# Altium footprint library ICs And Semiconductors SMD.PcbLib: 602 footprints (part 11 of 38)
Each footprint in its own frame and in the unit in brackets; x right, y up, seen from the top. Pads: shape width x height; smd on the part's side, far side on the other; paste and mask are expansions set on the pad; w line width, h text height; cw(c..) or ccw(c..) is an arc to the next point about the centre after c.
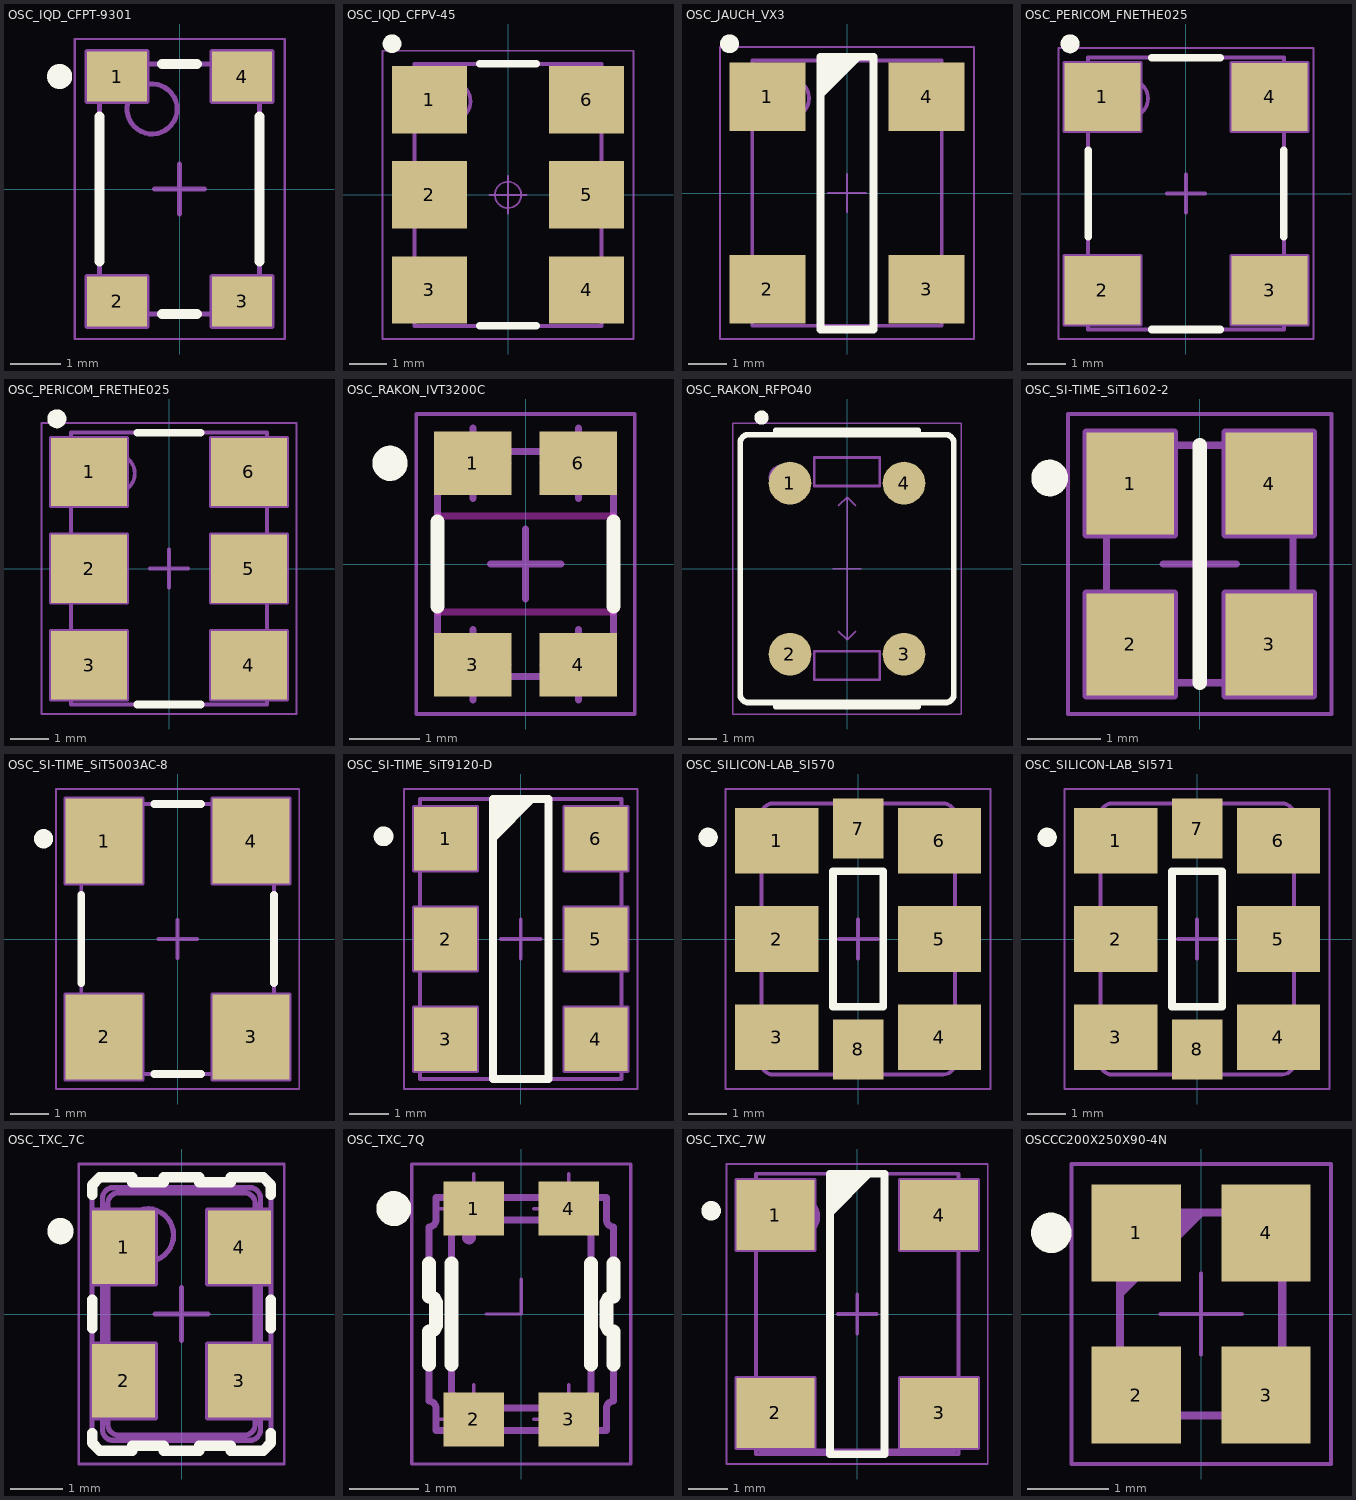
[diagram p10: the footprints below, top view; thin cyan lines are the x and y axes]

## OSC_IQD_CFPT-9301 [mm] "SMD Oscillator, Corner Convave, 4 pins, 5x3.2mm"
height 1.8
pads (4):
  rect 1.2x1 smd: 1(-1.25,2.25) 2(-1.25,-2.25) 3(1.25,-2.25) 4(1.25,2.25)
Top Overlay:
  circle w0.25: c-2.4,2.25 r0.125
  lines w0.2: -1.6,-1.45 -1.6,1.45 ; -0.35,-2.5 0.35,-2.5 ; -0.35,2.5 0.35,2.5 ; 1.6,-1.45 1.6,1.45
Mechanical 8:
  lines w0.1: -1.75,-2.25 -1.25,-2.25 ; -1.75,2.25 -1.25,2.25 ; -1.25,-2.75 -1.25,-2.25 ; -1.25,-1.75 -1.25,-2.25 ; -1.25,1.75 -1.25,2.25 ; -1.25,2.75 -1.25,2.25 ; -0.75,-2.25 -1.25,-2.25 ; -0.75,2.25 -1.25,2.25 ; -0.5,0 0,0 ; 0,-0.5 0,0 ; 0,0.5 0,0 ; 0.5,0 0,0 ; 0.75,-2.25 1.25,-2.25 ; 0.75,2.25 1.25,2.25 ; 1.25,-2.75 1.25,-2.25 ; 1.25,-1.75 1.25,-2.25 ; 1.25,1.75 1.25,2.25 ; 1.25,2.75 1.25,2.25 ; 1.75,-2.25 1.25,-2.25 ; 1.75,2.25 1.25,2.25 ; -1.85,-2.75 -1.85,-1.75 -0.65,-1.75 -0.65,-2.75 -1.85,-2.75 ; -1.85,1.75 -1.85,2.75 -0.65,2.75 -0.65,1.75 -1.85,1.75 ; 0.65,-2.75 0.65,-1.75 1.85,-1.75 1.85,-2.75 0.65,-2.75 ; 0.65,1.75 0.65,2.75 1.85,2.75 1.85,1.75 0.65,1.75
Mechanical 14:
  circle w0.1: c-0.55,1.6 r0.5
  lines w0.1: -1.6,-2.35 cw(c-1.6,-2.5) -1.45,-2.5 1.45,-2.5 cw(c1.6,-2.5) 1.6,-2.35 1.6,2.35 cw(c1.6,2.5) 1.45,2.5 -1.45,2.5 cw(c-1.6,2.5) -1.6,2.35 -1.6,-2.35
Mechanical 15:
  lines w0.05: -2.1,-3 -2.1,3 2.1,3 2.1,-3 -2.1,-3
3D body "OSC_IQD_CFPT-9301.stp": height 1.8, standoff 0, extent -1.6,-2.5 1.6,2.5

## OSC_IQD_CFPV-45 [mm] "SMD Oscillator, side convave, 6 pins, 5.00x7.00mm"
height 1.7
pads (6):
  rect 2x1.8 smd: 1(-2.1,2.54) 2(-2.1,0) 3(-2.1,-2.54) 4(2.1,-2.54) 5(2.1,0) 6(2.1,2.54)
Top Overlay:
  circle w0.25: c-3.1,4.04 r0.125
  lines w0.2: -0.75,-3.5 0.75,-3.5 ; -0.75,3.5 0.75,3.5
Mechanical 14:
  circle w0.1: c-1.5,2.5 r0.5
  lines w0.1: -2.5,-3.5 -2.5,3.5 2.5,3.5 2.5,-3.5 -2.5,-3.5
Mechanical 15:
  circle w0.05: c0,0 r0.35
  lines w0.05: -0.5,0 0.5,0 ; 0,-0.5 0,0.5 ; -3.35,-3.85 -3.35,3.85 3.35,3.85 3.35,-3.85 -3.35,-3.85
3D body "OSC_IQD_CFPV-45.stp": height 1.7, standoff 0, extent -2.6,-3.6 2.6,3.6

## OSC_JAUCH_VX3 [mm] "SMD Oscillator, Side Convave, 4 pins, 5.00x7.00mm, VX3 Serie"
height 1.75
pads (4):
  rect 2x1.8 smd: 1(-2.1,2.54) 2(-2.1,-2.54) 3(2.1,-2.54) 4(2.1,2.54)
Top Overlay:
  circle w0.25: c-3.1,3.94 r0.125
  lines w0.2: -0.7,2.6 0.3,3.6 ; -0.7,2.8 0.1,3.6 ; -0.7,3 -0.1,3.6 ; -0.7,3.2 -0.3,3.6 ; -0.7,3.4 -0.5,3.6 ; -0.7,-3.6 0.7,-3.6 0.7,3.6 -0.7,3.6 -0.7,-3.6
Mechanical 14:
  circle w0.1: c-1.5,2.5 r0.5
  lines w0.1: -2.5,-3.5 -2.5,3.5 2.5,3.5 2.5,-3.5 -2.5,-3.5
Mechanical 15:
  lines w0.05: -0.5,0 0.5,0 ; 0,-0.5 0,0.5 ; -3.35,-3.85 -3.35,3.85 3.35,3.85 3.35,-3.85 -3.35,-3.85
3D body "OSC_JAUCH_VX3.stp": height 1.75, standoff 0, extent -2.6,-3.6 2.6,3.6

## OSC_PERICOM_FNETHE025 [mm] "SMD Oscillator, side convave, 4 pins, 5.00x7.00mm"
height 1.55
pads (4):
  rect 2x1.8 smd: 1(-2.2,2.54) 2(-2.2,-2.54) 3(2.2,-2.54) 4(2.2,2.54)
Top Overlay:
  circle w0.25: c-3.05,3.94 r0.125
  lines w0.2: -2.575,-1.14 -2.575,1.14 ; -0.9,-3.575 0.9,-3.575 ; -0.9,3.575 0.9,3.575 ; 2.575,-1.14 2.575,1.14
Mechanical 8:
  lines w0.1: -2.7,-2.54 -2.2,-2.54 ; -2.7,2.54 -2.2,2.54 ; -2.2,-3.04 -2.2,-2.54 ; -2.2,-2.04 -2.2,-2.54 ; -2.2,2.04 -2.2,2.54 ; -2.2,3.04 -2.2,2.54 ; -1.7,-2.54 -2.2,-2.54 ; -1.7,2.54 -2.2,2.54 ; -0.5,0 0,0 ; 0,-0.5 0,0 ; 0,0.5 0,0 ; 0.5,0 0,0 ; 1.7,-2.54 2.2,-2.54 ; 1.7,2.54 2.2,2.54 ; 2.2,-3.04 2.2,-2.54 ; 2.2,-2.04 2.2,-2.54 ; 2.2,2.04 2.2,2.54 ; 2.2,3.04 2.2,2.54 ; 2.7,-2.54 2.2,-2.54 ; 2.7,2.54 2.2,2.54 ; -3.2,-3.44 -1.2,-3.44 -1.2,-1.64 -3.2,-1.64 -3.2,-3.44 ; -3.2,1.64 -1.2,1.64 -1.2,3.44 -3.2,3.44 -3.2,1.64 ; 1.2,-3.44 3.2,-3.44 3.2,-1.64 1.2,-1.64 1.2,-3.44 ; 1.2,1.64 3.2,1.64 3.2,3.44 1.2,3.44 1.2,1.64
Mechanical 14:
  circle w0.1: c-1.5,2.5 r0.5
  lines w0.1: -2.575,-3.575 -2.575,3.575 2.575,3.575 2.575,-3.575 -2.575,-3.575
Mechanical 15:
  lines w0.05: -3.35,-3.825 -3.35,3.825 3.35,3.825 3.35,-3.825 -3.35,-3.825
3D body "OSC_PERICOM_FNETHE025.stp": height 1.55, standoff 0, extent -2.6,-3.6 2.6,3.6

## OSC_PERICOM_FRETHE025 [mm] "SMD Oscillator, side convave, 6 pins, 5.00x7.00mm"
height 1.55
pads (6):
  rect 2x1.8 smd: 1(-2.1,2.54) 2(-2.1,0) 3(-2.1,-2.54) 4(2.1,-2.54) 5(2.1,0) 6(2.1,2.54)
Top Overlay:
  circle w0.25: c-2.95,3.94 r0.125
  lines w0.2: -0.832,-3.575 0.832,-3.575 ; -0.832,3.575 0.832,3.575
Mechanical 8:
  lines w0.1: -2.6,-2.54 -2.1,-2.54 ; -2.6,0 -2.1,0 ; -2.6,2.54 -2.1,2.54 ; -2.1,-3.04 -2.1,-2.54 ; -2.1,-2.04 -2.1,-2.54 ; -2.1,-0.5 -2.1,0 ; -2.1,0.5 -2.1,0 ; -2.1,2.04 -2.1,2.54 ; -2.1,3.04 -2.1,2.54 ; -1.6,-2.54 -2.1,-2.54 ; -1.6,0 -2.1,0 ; -1.6,2.54 -2.1,2.54 ; -0.5,0 0,0 ; 0,-0.5 0,0 ; 0,0.5 0,0 ; 0.5,0 0,0 ; 1.6,-2.54 2.1,-2.54 ; 1.6,0 2.1,0 ; 1.6,2.54 2.1,2.54 ; 2.1,-3.04 2.1,-2.54 ; 2.1,-2.04 2.1,-2.54 ; 2.1,-0.5 2.1,0 ; 2.1,0.5 2.1,0 ; 2.1,2.04 2.1,2.54 ; 2.1,3.04 2.1,2.54 ; 2.6,-2.54 2.1,-2.54 ; 2.6,0 2.1,0 ; 2.6,2.54 2.1,2.54 ; -3.1,-3.44 -3.1,-1.64 -1.1,-1.64 -1.1,-3.44 -3.1,-3.44 ; -3.1,-0.9 -3.1,0.9 -1.1,0.9 -1.1,-0.9 -3.1,-0.9 ; -3.1,1.64 -3.1,3.44 -1.1,3.44 -1.1,1.64 -3.1,1.64 ; 1.1,-3.44 1.1,-1.64 3.1,-1.64 3.1,-3.44 1.1,-3.44 ; 1.1,-0.9 1.1,0.9 3.1,0.9 3.1,-0.9 1.1,-0.9 ; 1.1,1.64 1.1,3.44 3.1,3.44 3.1,1.64 1.1,1.64
Mechanical 14:
  circle w0.1: c-1.4,2.5 r0.5
  lines w0.1: -2.575,-3.575 -2.575,3.575 2.575,3.575 2.575,-3.575 -2.575,-3.575
Mechanical 15:
  lines w0.05: -3.35,-3.825 -3.35,3.825 3.35,3.825 3.35,-3.825 -3.35,-3.825
3D body "OSC_PERICOM_FRETHE025.stp": height 1.55, standoff 0, extent -2.575,-3.575 2.575,3.575

## OSC_RAKON_IVT3200C [mm] "Oscillator IVT3200C Serie, Corner Concave; 4 pin, 2.50mm L X 3.2mm W X 1.1mm H"
height 1.1
pads (4):
  rect 1.1x0.9 smd: 1(-0.75,1.43) 3(-0.75,-1.43) 4(0.75,-1.43) 6(0.75,1.43)
Top Layer keep-out:
  lines w0.1: -1.25,-0.68 1.25,-0.68 1.25,0.68 -1.25,0.68 -1.25,-0.68
Top Overlay:
  circle w0.25: c-1.925,1.43 r0.125
  lines w0.2: -1.25,-0.6 -1.25,0.6 ; 1.25,-0.6 1.25,0.6
Mechanical 8:
  lines w0.1: -1.25,-1.43 -0.75,-1.43 ; -1.25,1.43 -0.75,1.43 ; -0.75,-1.93 -0.75,-1.43 ; -0.75,-0.93 -0.75,-1.43 ; -0.75,0.93 -0.75,1.43 ; -0.75,1.93 -0.75,1.43 ; -0.5,0 0,0 ; -0.25,-1.43 -0.75,-1.43 ; -0.25,1.43 -0.75,1.43 ; 0,-0.5 0,0 ; 0,0.5 0,0 ; 0.25,-1.43 0.75,-1.43 ; 0.25,1.43 0.75,1.43 ; 0.5,0 0,0 ; 0.75,-1.93 0.75,-1.43 ; 0.75,-0.93 0.75,-1.43 ; 0.75,0.93 0.75,1.43 ; 0.75,1.93 0.75,1.43 ; 1.25,-1.43 0.75,-1.43 ; 1.25,1.43 0.75,1.43
Mechanical 14:
  lines w0.1: -1.25,-1.5 cw(c-1.25,-1.6) -1.15,-1.6 1.15,-1.6 cw(c1.25,-1.6) 1.25,-1.5 1.25,1.5 cw(c1.25,1.6) 1.15,1.6 -1.15,1.6 cw(c-1.25,1.6) -1.25,1.5 -1.25,-1.5
Mechanical 15:
  lines w0.05: -1.55,-2.13 -1.55,2.13 1.55,2.13 1.55,-2.13 -1.55,-2.13
3D body "OSC_RAKON_IVT3200C.stp": height 1, standoff 0, extent -1.25,-1.6 1.25,1.6

## OSC_RAKON_RFPO40 [mm] "RFPO40 Case, SMD Oscillator, 4 pins, Body 9.7x7.5mm"
height 4.2
pads (4):
  round 1.5 smd: 1(-2,3) 2(-2,-3) 3(2,-3) 4(2,3)
Top Overlay:
  circle w0.25: c-3,5.3 r0.125
  lines w0.2: -2.5,-4.7 -2.5,-4.85 2.5,-4.85 2.5,-4.7 ; -2.5,4.7 -2.5,4.85 2.5,4.85 2.5,4.7 ; -3.75,-4.4 ccw(c-3.45,-4.4) -3.45,-4.7 3.45,-4.7 ccw(c3.45,-4.4) 3.75,-4.4 3.75,4.4 ccw(c3.45,4.4) 3.45,4.7 -3.45,4.7 ccw(c-3.45,4.4) -3.75,4.4 -3.75,-4.4
Mechanical 8:
  lines w0.05: -0.3,-2.2 0,-2.5 ; -0.3,2.2 0,2.5 ; 0.3,-2.2 0,-2.5 ; 0.3,2.2 0,2.5 ; 0,-2.5 0,2.5
  lines w0.1: -2.5,-3 -2,-3 -2,-2.5 ; -2.5,3 -2,3 -2,3.5 ; 1.5,-3 2,-3 2,-2.5 ; 1.5,3 2,3 2,3.5 ; -1.15,-3.9 -1.15,-2.9 1.15,-2.9 1.15,-3.9 -1.15,-3.9 ; -1.15,2.9 -1.15,3.9 1.15,3.9 1.15,2.9 -1.15,2.9
  text "Keepout Area on Top" at -0.5,-2.5 h0.35
Mechanical 14:
  circle w0.1: c-2.3,3.2 r0.4
  lines w0.1: -2.5,-4.7 -2.5,-4.85 2.5,-4.85 2.5,-4.7 ; -2.5,4.7 -2.5,4.85 2.5,4.85 2.5,4.7 ; -3.75,-4.4 ccw(c-3.45,-4.4) -3.45,-4.7 3.45,-4.7 ccw(c3.45,-4.4) 3.75,-4.4 3.75,4.4 ccw(c3.45,4.4) 3.45,4.7 -3.45,4.7 ccw(c-3.45,4.4) -3.75,4.4 -3.75,-4.4
Mechanical 15:
  lines w0.05: -0.5,0 0.5,0 ; 0,-0.5 0,0.5 ; -4,-5.1 -4,5.1 4,5.1 4,-5.1 -4,-5.1
3D body "OSC_RAKON_RFPO40.stp": height 5.95, standoff 0, extent -3.75,-4.85 3.75,4.85

## OSC_SI-TIME_SiT1602-2 [mm] "SiT1602 Oscillators Series, Version 3.2mmx2.5mm, Pitch 2.1mm; 4 Pin"
height 0.8
pads (4):
  rect 1.2x1.4 smd: 1(-0.95,1.1) 2(-0.95,-1.1) 3(0.95,-1.1) 4(0.95,1.1)
Top Overlay:
  circle w0.25: c-2.05,1.175 r0.125
  lines w0.2: 0,-1.625 0,1.625
Mechanical 8:
  lines w0.1: -1.45,-1.1 -0.95,-1.1 ; -1.45,1.1 -0.95,1.1 ; -0.95,-1.6 -0.95,-1.1 ; -0.95,-0.6 -0.95,-1.1 ; -0.95,0.6 -0.95,1.1 ; -0.95,1.6 -0.95,1.1 ; -0.5,0 0,0 ; -0.45,-1.1 -0.95,-1.1 ; -0.45,1.1 -0.95,1.1 ; 0,-0.5 0,0 ; 0,0.5 0,0 ; 0.45,-1.1 0.95,-1.1 ; 0.45,1.1 0.95,1.1 ; 0.5,0 0,0 ; 0.95,-1.6 0.95,-1.1 ; 0.95,-0.6 0.95,-1.1 ; 0.95,0.6 0.95,1.1 ; 0.95,1.6 0.95,1.1 ; 1.45,-1.1 0.95,-1.1 ; 1.45,1.1 0.95,1.1 ; -1.55,-1.8 -1.55,-0.4 -0.35,-0.4 -0.35,-1.8 -1.55,-1.8 ; -1.55,0.4 -1.55,1.8 -0.35,1.8 -0.35,0.4 -1.55,0.4 ; 0.35,-1.8 0.35,-0.4 1.55,-0.4 1.55,-1.8 0.35,-1.8 ; 0.35,0.4 0.35,1.8 1.55,1.8 1.55,0.4 0.35,0.4
Mechanical 14:
  circle w0.1: c-0.775,1.125 r0.25
  lines w0.1: -1.275,-1.625 1.275,-1.625 1.275,1.625 -1.275,1.625 -1.275,-1.625
Mechanical 15:
  lines w0.05: -1.8,-2.05 -1.8,2.05 1.8,2.05 1.8,-2.05 -1.8,-2.05
3D body "OSC_SI-TIME_SiT1602-2.stp": height 0.8, standoff 0, extent -1.275,-1.625 1.275,1.625

## OSC_SI-TIME_SiT5003AC-8 [mm] "SiT5003AC Oscillator, Version 5.08mm Pitch; 4 Pin, 5.00mm L X 7.00mm W X 1mm H"
height 1
pads (4):
  rect 2x2.2 smd: 1(-1.905,2.54) 2(-1.905,-2.54) 3(1.905,-2.54) 4(1.905,2.54)
Top Overlay:
  circle w0.25: c-3.475,2.6 r0.125
  lines w0.2: -2.5,-1.14 -2.5,1.14 ; -0.605,-3.5 0.605,-3.5 ; -0.605,3.5 0.605,3.5 ; 2.5,-1.14 2.5,1.14
Mechanical 8:
  lines w0.1: -2.405,-2.54 -1.905,-2.54 ; -2.405,2.54 -1.905,2.54 ; -1.905,-3.04 -1.905,-2.54 ; -1.905,-2.04 -1.905,-2.54 ; -1.905,2.04 -1.905,2.54 ; -1.905,3.04 -1.905,2.54 ; -1.405,-2.54 -1.905,-2.54 ; -1.405,2.54 -1.905,2.54 ; -0.5,0 0,0 ; 0,-0.5 0,0 ; 0,0.5 0,0 ; 0.5,0 0,0 ; 1.405,-2.54 1.905,-2.54 ; 1.405,2.54 1.905,2.54 ; 1.905,-3.04 1.905,-2.54 ; 1.905,-2.04 1.905,-2.54 ; 1.905,2.04 1.905,2.54 ; 1.905,3.04 1.905,2.54 ; 2.405,-2.54 1.905,-2.54 ; 2.405,2.54 1.905,2.54 ; -2.905,-3.64 -0.905,-3.64 -0.905,-1.44 -2.905,-1.44 -2.905,-3.64 ; -2.905,1.44 -0.905,1.44 -0.905,3.64 -2.905,3.64 -2.905,1.44 ; 0.905,-3.64 2.905,-3.64 2.905,-1.44 0.905,-1.44 0.905,-3.64 ; 0.905,1.44 2.905,1.44 2.905,3.64 0.905,3.64 0.905,1.44
Mechanical 14:
  circle w0.1: c-1.505,2.55 r0.4
  lines w0.1: -2.5,-3.5 -2.5,3.5 2.5,3.5 2.5,-3.5 -2.5,-3.5
Mechanical 15:
  lines w0.05: -3.155,-3.89 -3.155,3.89 3.155,3.89 3.155,-3.89 -3.155,-3.89
3D body "OSC_SI-TIME_SiT5003AC-8.stp": height 1, standoff 0, extent -2.5,-3.5 2.5,3.5

## OSC_SI-TIME_SiT9120-D [mm] "SiT9120 Oscillators Series, Version 7mmx5mm, Pitch 2.54mm; 6 Pin"
height 1
pads (6):
  rect 1.6x1.6 smd: 1(-1.905,2.54) 2(-1.905,0) 3(-1.905,-2.54) 4(1.905,-2.54) 5(1.905,0) 6(1.905,2.54)
Top Overlay:
  circle w0.25: c-3.475,2.6 r0.125
  lines w0.2: -0.705,2.55 0.295,3.55 ; -0.705,2.75 0.095,3.55 ; -0.705,2.95 -0.105,3.55 ; -0.705,3.15 -0.305,3.55 ; -0.705,3.35 -0.505,3.55 ; -0.705,-3.55 -0.705,3.55 0.705,3.55 0.705,-3.55 -0.705,-3.55
Mechanical 8:
  lines w0.1: -2.405,-2.54 -1.905,-2.54 ; -2.405,0 -1.905,0 ; -2.405,2.54 -1.905,2.54 ; -1.905,-3.04 -1.905,-2.54 ; -1.905,-2.04 -1.905,-2.54 ; -1.905,-0.5 -1.905,0 ; -1.905,0.5 -1.905,0 ; -1.905,2.04 -1.905,2.54 ; -1.905,3.04 -1.905,2.54 ; -1.405,-2.54 -1.905,-2.54 ; -1.405,0 -1.905,0 ; -1.405,2.54 -1.905,2.54 ; -0.5,0 0,0 ; 0,-0.5 0,0 ; 0,0.5 0,0 ; 0.5,0 0,0 ; 1.405,-2.54 1.905,-2.54 ; 1.405,0 1.905,0 ; 1.405,2.54 1.905,2.54 ; 1.905,-3.04 1.905,-2.54 ; 1.905,-2.04 1.905,-2.54 ; 1.905,-0.5 1.905,0 ; 1.905,0.5 1.905,0 ; 1.905,2.04 1.905,2.54 ; 1.905,3.04 1.905,2.54 ; 2.405,-2.54 1.905,-2.54 ; 2.405,0 1.905,0 ; 2.405,2.54 1.905,2.54 ; -2.705,-3.34 -1.105,-3.34 -1.105,-1.74 -2.705,-1.74 -2.705,-3.34 ; -2.705,-0.8 -1.105,-0.8 -1.105,0.8 -2.705,0.8 -2.705,-0.8 ; -2.705,1.74 -1.105,1.74 -1.105,3.34 -2.705,3.34 -2.705,1.74 ; 1.105,-3.34 2.705,-3.34 2.705,-1.74 1.105,-1.74 1.105,-3.34 ; 1.105,-0.8 2.705,-0.8 2.705,0.8 1.105,0.8 1.105,-0.8 ; 1.105,1.74 2.705,1.74 2.705,3.34 1.105,3.34 1.105,1.74
Mechanical 14:
  circle w0.1: c-1.505,2.55 r0.4
  lines w0.1: -2.55,-3.55 -2.55,3.55 2.55,3.55 2.55,-3.55 -2.55,-3.55
Mechanical 15:
  lines w0.05: -2.955,-3.8 2.955,-3.8 2.955,3.8 -2.955,3.8 -2.955,-3.8
3D body "OSC_SI-TIME_SiT9120-D.stp": height 1, standoff 0, extent -2.55,-3.55 2.55,3.55

## OSC_SILICON-LAB_SI570 [mm] "Oscillator Si570 Series, 8 pins, 5x7mm"
height 1.85
pads (8):
  rect 2.15x1.7 smd: 1(-2.1,2.54) 2(-2.1,0) 3(-2.1,-2.54) 4(2.1,-2.54) 5(2.1,0) 6(2.1,2.54)
  rect 1.3x1.545 smd: 7(0,2.853) 8(0,-2.853)
Top Overlay:
  circle w0.25: c-3.875,2.625 r0.125
  lines w0.2: -0.65,-1.75 0.65,-1.75 0.65,1.75 -0.65,1.75 -0.65,-1.75
Mechanical 8:
  lines w0.1: -2.6,-2.54 -2.1,-2.54 ; -2.6,0 -2.1,0 ; -2.6,2.54 -2.1,2.54 ; -2.1,-3.04 -2.1,-2.54 ; -2.1,-2.04 -2.1,-2.54 ; -2.1,-0.5 -2.1,0 ; -2.1,0.5 -2.1,0 ; -2.1,2.04 -2.1,2.54 ; -2.1,3.04 -2.1,2.54 ; -1.6,-2.54 -2.1,-2.54 ; -1.6,0 -2.1,0 ; -1.6,2.54 -2.1,2.54 ; -0.5,-2.853 0,-2.853 ; -0.5,0 0,0 ; -0.5,2.853 0,2.853 ; 0,-3.353 0,-2.853 ; 0,-2.353 0,-2.853 ; 0,-0.5 0,0 ; 0,0.5 0,0 ; 0,2.353 0,2.853 ; 0,3.353 0,2.853 ; 0.5,-2.853 0,-2.853 ; 0.5,0 0,0 ; 0.5,2.853 0,2.853 ; 1.6,-2.54 2.1,-2.54 ; 1.6,0 2.1,0 ; 1.6,2.54 2.1,2.54 ; 2.1,-3.04 2.1,-2.54 ; 2.1,-2.04 2.1,-2.54 ; 2.1,-0.5 2.1,0 ; 2.1,0.5 2.1,0 ; 2.1,2.04 2.1,2.54 ; 2.1,3.04 2.1,2.54 ; 2.6,-2.54 2.1,-2.54 ; 2.6,0 2.1,0 ; 2.6,2.54 2.1,2.54
Mechanical 14:
  circle w0.1: c-1.7,2.55 r0.4
  lines w0.1: -2.5,-3.2 ccw(c-2.2,-3.2) -2.2,-3.5 2.2,-3.5 ccw(c2.2,-3.2) 2.5,-3.2 2.5,3.2 ccw(c2.2,3.2) 2.2,3.5 -2.2,3.5 ccw(c-2.2,3.2) -2.5,3.2 -2.5,-3.2
Mechanical 15:
  lines w0.05: -3.425,-3.875 3.425,-3.875 3.425,3.875 -3.425,3.875 -3.425,-3.875
3D body "OSC_SILICON-LAB_SI570.stp": height 1.85, standoff 0, extent -2.5,-3.5 2.5,3.5

## OSC_SILICON-LAB_SI571 [mm] "Oscillator Si571 Series, 8 pins, 5x7mm"
height 1.85
pads (8):
  rect 2.15x1.7 smd: 1(-2.1,2.54) 2(-2.1,0) 3(-2.1,-2.54) 4(2.1,-2.54) 5(2.1,0) 6(2.1,2.54)
  rect 1.3x1.545 smd: 7(0,2.853) 8(0,-2.853)
Top Overlay:
  circle w0.25: c-3.875,2.625 r0.125
  lines w0.2: -0.65,-1.75 0.65,-1.75 0.65,1.75 -0.65,1.75 -0.65,-1.75
Mechanical 8:
  lines w0.1: -2.6,-2.54 -2.1,-2.54 ; -2.6,0 -2.1,0 ; -2.6,2.54 -2.1,2.54 ; -2.1,-3.04 -2.1,-2.54 ; -2.1,-2.04 -2.1,-2.54 ; -2.1,-0.5 -2.1,0 ; -2.1,0.5 -2.1,0 ; -2.1,2.04 -2.1,2.54 ; -2.1,3.04 -2.1,2.54 ; -1.6,-2.54 -2.1,-2.54 ; -1.6,0 -2.1,0 ; -1.6,2.54 -2.1,2.54 ; -0.5,-2.853 0,-2.853 ; -0.5,0 0,0 ; -0.5,2.853 0,2.853 ; 0,-3.353 0,-2.853 ; 0,-2.353 0,-2.853 ; 0,-0.5 0,0 ; 0,0.5 0,0 ; 0,2.353 0,2.853 ; 0,3.353 0,2.853 ; 0.5,-2.853 0,-2.853 ; 0.5,0 0,0 ; 0.5,2.853 0,2.853 ; 1.6,-2.54 2.1,-2.54 ; 1.6,0 2.1,0 ; 1.6,2.54 2.1,2.54 ; 2.1,-3.04 2.1,-2.54 ; 2.1,-2.04 2.1,-2.54 ; 2.1,-0.5 2.1,0 ; 2.1,0.5 2.1,0 ; 2.1,2.04 2.1,2.54 ; 2.1,3.04 2.1,2.54 ; 2.6,-2.54 2.1,-2.54 ; 2.6,0 2.1,0 ; 2.6,2.54 2.1,2.54
Mechanical 14:
  circle w0.1: c-1.7,2.55 r0.4
  lines w0.1: -2.5,-3.2 ccw(c-2.2,-3.2) -2.2,-3.5 2.2,-3.5 ccw(c2.2,-3.2) 2.5,-3.2 2.5,3.2 ccw(c2.2,3.2) 2.2,3.5 -2.2,3.5 ccw(c-2.2,3.2) -2.5,3.2 -2.5,-3.2
Mechanical 15:
  lines w0.05: -3.425,-3.875 3.425,-3.875 3.425,3.875 -3.425,3.875 -3.425,-3.875
3D body "OSC_SILICON-LAB_SI571.stp": height 1.85, standoff 0, extent -2.5,-3.5 2.5,3.5

## OSC_TXC_7C [mm] "SMD Oscillator, 4 pins, 5 x 3.2mm, 7C Serie"
height 1.4
pads (4):
  rect 1.2x1.4 smd: 1(-1.1,1.27) 2(-1.1,-1.27) 3(1.1,-1.27) 4(1.1,1.27)
Top Overlay:
  circle w0.25: c-2.3,1.575 r0.125
  lines w0.2: -1.7,-2.27 -1.7,-2.45 -1.55,-2.6 -0.935,-2.6 -0.935,-2.5 -0.335,-2.5 -0.335,-2.6 ; -1.7,-0.27 -1.7,0.27 ; -1.7,2.27 -1.7,2.45 -1.55,2.6 -0.935,2.6 -0.935,2.5 -0.335,2.5 -0.335,2.6 0.335,2.6 0.335,2.5 0.935,2.5 0.935,2.6 1.55,2.6 1.7,2.45 1.7,2.27 ; 1.7,-2.27 1.7,-2.45 1.55,-2.6 0.935,-2.6 0.935,-2.5 0.335,-2.5 0.335,-2.6 ; 1.7,-0.27 1.7,0.27 ; -0.335,-2.6 0.335,-2.6 ; -0.335,-2.6 0.335,-2.6
Mechanical 8:
  lines w0.1: -1.6,-1.27 -1.1,-1.27 ; -1.6,1.27 -1.1,1.27 ; -1.1,-1.77 -1.1,-1.27 ; -1.1,-0.77 -1.1,-1.27 ; -1.1,0.77 -1.1,1.27 ; -1.1,1.77 -1.1,1.27 ; -0.6,-1.27 -1.1,-1.27 ; -0.6,1.27 -1.1,1.27 ; -0.5,0 0,0 ; 0,-0.5 0,0 ; 0,0.5 0,0 ; 0.5,0 0,0 ; 0.6,-1.27 1.1,-1.27 ; 0.6,1.27 1.1,1.27 ; 1.1,-1.77 1.1,-1.27 ; 1.1,-0.77 1.1,-1.27 ; 1.1,0.77 1.1,1.27 ; 1.1,1.77 1.1,1.27 ; 1.6,-1.27 1.1,-1.27 ; 1.6,1.27 1.1,1.27 ; -1.7,-1.97 -0.5,-1.97 -0.5,-0.57 -1.7,-0.57 -1.7,-1.97 ; -1.7,0.57 -0.5,0.57 -0.5,1.97 -1.7,1.97 -1.7,0.57 ; 0.5,-1.97 0.5,-0.57 1.7,-0.57 1.7,-1.97 0.5,-1.97 ; 0.5,0.57 1.7,0.57 1.7,1.97 0.5,1.97 0.5,0.57
Mechanical 14:
  circle w0.1: c-0.65,1.5 r0.5
  lines w0.1: -0.335,-2.6 0.335,-2.6 ; -0.335,-2.6 -0.335,-2.5 -0.935,-2.5 -0.935,-2.6 -1.55,-2.6 -1.7,-2.45 -1.7,-1.97 -1.6,-1.87 -1.6,-0.67 -1.7,-0.57 -1.7,0.57 -1.6,0.67 -1.6,1.87 -1.7,1.97 -1.7,2.45 -1.55,2.6 -0.935,2.6 -0.935,2.5 -0.335,2.5 -0.335,2.6 0.335,2.6 0.335,2.5 0.935,2.5 0.935,2.6 1.55,2.6 1.7,2.45 1.7,1.97 1.6,1.87 1.6,0.67 1.7,0.57 1.7,-0.57 1.6,-0.67 1.6,-1.87 1.7,-1.97 1.7,-2.45 1.55,-2.6 0.935,-2.6 0.935,-2.5 0.335,-2.5 0.335,-2.6 ; -0.335,-2.6 0.335,-2.6 ; -1.5,-2.2 ccw(c-1.3,-2.2) -1.3,-2.4 1.3,-2.4 ccw(c1.3,-2.2) 1.5,-2.2 1.5,2.2 ccw(c1.3,2.2) 1.3,2.4 -1.3,2.4 ccw(c-1.3,2.2) -1.5,2.2 -1.5,-2.2 ; -1.4,-2.1 ccw(c-1.2,-2.1) -1.2,-2.3 1.2,-2.3 ccw(c1.2,-2.1) 1.4,-2.1 1.4,2.1 ccw(c1.2,2.1) 1.2,2.3 -1.2,2.3 ccw(c-1.2,2.1) -1.4,2.1 -1.4,-2.1
Mechanical 15:
  lines w0.05: -1.95,-2.85 1.95,-2.85 1.95,2.85 -1.95,2.85 -1.95,-2.85
3D body "OSC_TXC_7C.stp": height 1.4, standoff 0, extent -1.7,-2.6 1.7,2.6

## OSC_TXC_7Q [mm] "SMD Oscillator, 4 pins, 3.2 x 2.5mm, 7Q Series"
height 1.1
pads (4):
  rect 0.87x0.78 smd: 1(-0.68,1.515) 2(-0.68,-1.515) 3(0.68,-1.515) 4(0.68,1.515)
Top Overlay:
  circle w0.25: c-1.83,1.515 r0.125
  lines w0.2: -1.325,-0.725 -1.325,-0.25 ccw(c-1.325,-0.15) -1.225,-0.15 -1.225,0.15 ccw(c-1.325,0.15) -1.325,0.25 -1.325,0.725 ; -1,-0.725 -1,0.725 ; 1,-0.725 1,0.725 ; 1.325,-0.725 1.325,-0.25 cw(c1.325,-0.15) 1.225,-0.15 1.225,0.15 cw(c1.325,0.15) 1.325,0.25 1.325,0.725
Mechanical 8:
  lines w0.05: -1.18,-1.515 -0.68,-1.515 -0.68,-1.015 ; -1.18,1.515 -0.68,1.515 -0.68,2.015 ; -0.5,0 0,0 0,0.5 ; 0.18,-1.515 0.68,-1.515 0.68,-1.015 ; 0.18,1.515 0.68,1.515 0.68,2.015
Mechanical 14:
  circle w0.1: c-0.75,1.1 r0.05
  lines w0.1: -1.325,-1.25 cw(c-1.325,-1.35) -1.225,-1.35 -1.225,-1.675 -0.77,-1.675 cw(c-0.67,-1.675) -0.67,-1.575 -0.6,-1.575 cw(c-0.6,-1.675) -0.5,-1.675 0.5,-1.675 cw(c0.6,-1.675) 0.6,-1.575 0.67,-1.575 cw(c0.67,-1.675) 0.77,-1.675 1.225,-1.675 1.225,-1.35 cw(c1.325,-1.35) 1.325,-1.25 1.325,-0.25 cw(c1.325,-0.15) 1.225,-0.15 1.225,0.15 cw(c1.325,0.15) 1.325,0.25 1.325,1.25 cw(c1.325,1.35) 1.225,1.35 1.225,1.675 0.77,1.675 cw(c0.67,1.675) 0.67,1.575 0.6,1.575 cw(c0.6,1.675) 0.5,1.675 -0.5,1.675 cw(c-0.6,1.675) -0.6,1.575 -0.67,1.575 cw(c-0.67,1.675) -0.77,1.675 -1.225,1.675 -1.225,1.35 cw(c-1.325,1.35) -1.325,1.25 -1.325,0.25 cw(c-1.325,0.15) -1.225,0.15 -1.225,-0.15 cw(c-1.325,-0.15) -1.325,-0.25 -1.325,-1.25 ; -1,-1.1 ccw(c-0.75,-1.1) -0.75,-1.35 0.75,-1.35 ccw(c0.75,-1.1) 1,-1.1 1,1.1 ccw(c0.75,1.1) 0.75,1.35 -0.75,1.35 ccw(c-0.75,1.1) -1,1.1 -1,-1.1
Mechanical 15:
  lines w0.05: -1.575,-2.155 -1.575,2.155 1.575,2.155 1.575,-2.155 -1.575,-2.155
3D body "OSC_TXC_7Q.stp": height 1.1, standoff 0, extent -1.325,-1.675 1.325,1.675

## OSC_TXC_7W [mm] "SMD Oscillator, Side Convave, 4 pins, 5.00x7.00mm 7W Serie"
height 1.5
pads (4):
  rect 2x1.8 smd: 1(-2.1,2.54) 2(-2.1,-2.54) 3(2.1,-2.54) 4(2.1,2.54)
Top Overlay:
  circle w0.25: c-3.75,2.65 r0.125
  lines w0.2: -0.7,2.6 0.3,3.6 ; -0.7,2.8 0.1,3.6 ; -0.7,3 -0.1,3.6 ; -0.7,3.2 -0.3,3.6 ; -0.7,3.4 -0.5,3.6 ; -0.7,-3.6 -0.7,3.6 0.7,3.6 0.7,-3.6 -0.7,-3.6
Mechanical 8:
  lines w0.1: -2.6,-2.54 -2.1,-2.54 ; -2.6,2.54 -2.1,2.54 ; -2.1,-3.04 -2.1,-2.54 ; -2.1,-2.04 -2.1,-2.54 ; -2.1,2.04 -2.1,2.54 ; -2.1,3.04 -2.1,2.54 ; -1.6,-2.54 -2.1,-2.54 ; -1.6,2.54 -2.1,2.54 ; -0.5,0 0,0 ; 0,-0.5 0,0 ; 0,0.5 0,0 ; 0.5,0 0,0 ; 1.6,-2.54 2.1,-2.54 ; 1.6,2.54 2.1,2.54 ; 2.1,-3.04 2.1,-2.54 ; 2.1,-2.04 2.1,-2.54 ; 2.1,2.04 2.1,2.54 ; 2.1,3.04 2.1,2.54 ; 2.6,-2.54 2.1,-2.54 ; 2.6,2.54 2.1,2.54 ; -3.1,-3.44 -3.1,-1.64 -1.1,-1.64 -1.1,-3.44 -3.1,-3.44 ; -3.1,1.64 -3.1,3.44 -1.1,3.44 -1.1,1.64 -3.1,1.64 ; 1.1,-3.44 1.1,-1.64 3.1,-1.64 3.1,-3.44 1.1,-3.44 ; 1.1,1.64 1.1,3.44 3.1,3.44 3.1,1.64 1.1,1.64
Mechanical 14:
  circle w0.1: c-1.5,2.5 r0.5
  lines w0.1: -2.5,-3.5 2.5,-3.5 ; -2.6,-3.6 2.6,-3.6 2.6,3.6 -2.6,3.6 -2.6,-3.6
Mechanical 15:
  lines w0.05: -3.35,-3.85 -3.35,3.85 3.35,3.85 3.35,-3.85 -3.35,-3.85
3D body "OSC_TXC_7W.stp": height 1.42, standoff 0, extent -2.6,-3.6 2.6,3.6

## OSCCC200X250X90-4N [mm] "Oscillator, corner concave; 4 pin, 2.50mm L X 2.00mm W X 0.90mm H, IPC Medium Density"
height 0.9
pads (4):
  rect 1.1x1.2 smd: 1(-0.8,1) 2(-0.8,-1) 3(0.8,-1) 4(0.8,1)
Top Overlay:
  circle w0.25: c-1.85,1 r0.125
Mechanical 14:
  lines w0.1: -1,0.25 0,1.25 ; -1,0.35 -0.1,1.25 ; -1,0.45 -0.2,1.25 ; -1,0.55 -0.3,1.25 ; -1,0.65 -0.4,1.25 ; -1,0.75 -0.5,1.25 ; -1,0.85 -0.6,1.25 ; -1,0.95 -0.7,1.25 ; -1,1.05 -0.8,1.25 ; -1,1.15 -0.9,1.25 ; -1,-1.25 -1,1.25 1,1.25 1,-1.25 -1,-1.25
Mechanical 15:
  lines w0.05: -0.5,0 0.5,0 ; 0,-0.5 0,0.5 ; -1.6,-1.85 -1.6,1.85 1.6,1.85 1.6,-1.85 -1.6,-1.85
3D body "OSCCC200X250X90-4N.stp": height 0.8, standoff 0, extent -1.075,-1.325 1.075,1.325